# Altium footprint library coral-baseboard.PcbLib: 48 footprints (part 2 of 3)
Each footprint in its own frame and in the unit in brackets; x right, y up, seen from the top. Pads: shape width x height; smd on the part's side, far side on the other; paste and mask are expansions set on the pad; w line width, h text height; cw(c..) or ccw(c..) is an arc to the next point about the centre after c.
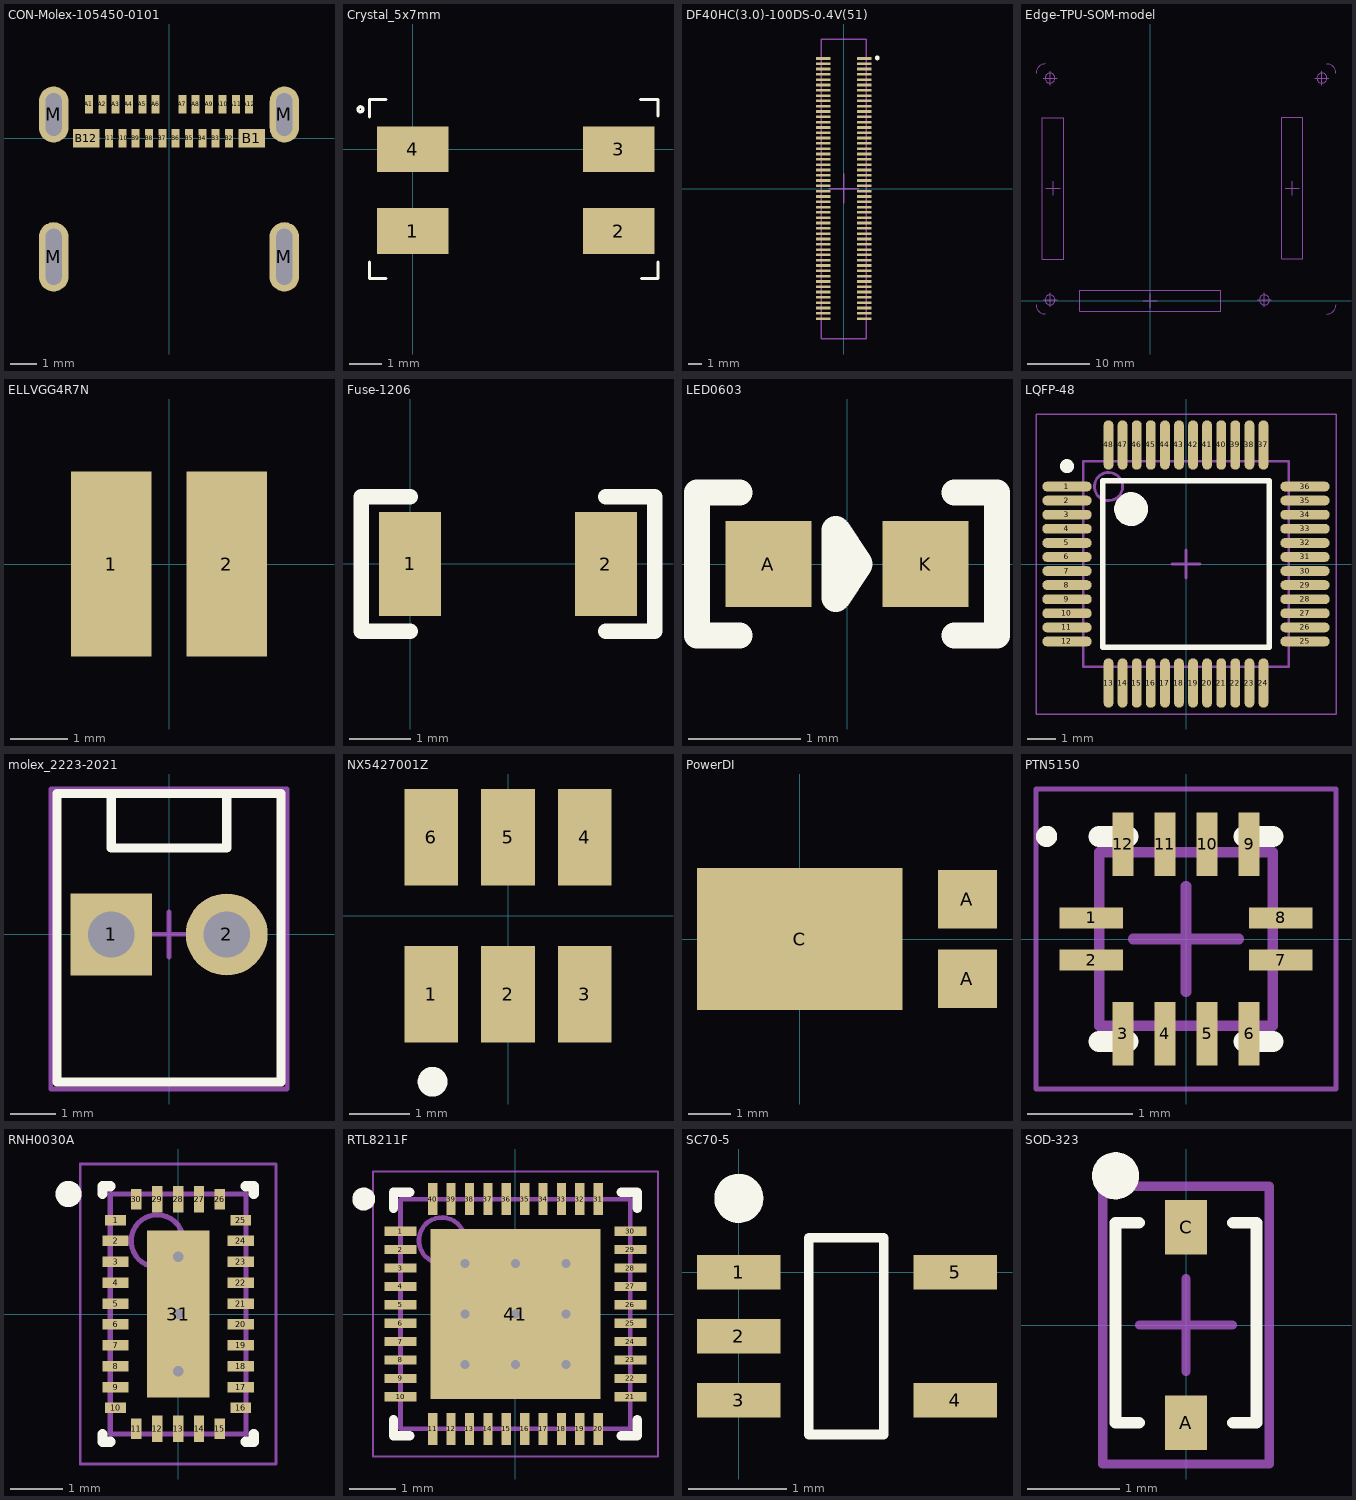
[diagram p1: the footprints below, top view; thin cyan lines are the x and y axes]

## CON-Molex-105450-0101 [mm]
height 2
pads (28):
  rect 0.3x0.7 smd: A1(-3,1.27) A2(-2.5,1.27) A3(-2,1.27) A4(-1.5,1.27) A5(-1,1.27) A6(-0.5,1.27) A7(0.5,1.27) A8(1,1.27) A9(1.5,1.27) A10(2,1.27) A11(2.5,1.27) A12(3,1.27) B2(2.25,0) B3(1.75,0) B4(1.25,0) B5(0.75,0) B6(0.25,0) B7(-0.25,0) B8(-0.75,0) B9(-1.25,0) B10(-1.75,0) B11(-2.25,0)
  rect 1x0.7 smd: B1(3.1,0) B12(-3.1,0)
  oval 1.1x2.6 hole 0.6 slot 2.1 at 90 deg: M(-4.32,-4.445) M(4.318,-4.445)
  oval 1.1x2.1 hole 0.6 slot 1.6 at 90 deg: M(-4.32,0.89) M(4.32,0.89)
3D body: height 3.22, standoff -0.74, extent -4.47,-6.351 4.47,1.549

## Crystal_5x7mm [mm]
height 1.1
pads (4):
  rect 2.2x1.4 smd: 1(0,-2.5) 2(6.3,-2.5) 3(6.3,0) 4(0,0)
Top Overlay:
  circle w0.1: c-1.6,1.225 r0.075
  lines w0.1: -1.325,-3.45 -1.325,-3.95 -0.825,-3.95 ; -1.325,1 -1.325,1.5 ; -1.325,1.525 -0.825,1.525 ; 6.975,1.525 7.475,1.525 ; 7,-3.95 7.5,-3.95 7.5,-3.45 ; 7.5,1.025 7.5,1.525
3D body: height 1.45, standoff 0.04, extent -0.35,-3.7 6.65,1.3

## DF40HC(3.0)-100DS-0.4V(51) [mm]
height 1.1
pads (100):
  rect 1.1x0.2 smd: 1(1.54,9.8) 2(-1.54,9.8) 3(1.54,9.4) 4(-1.54,9.4) 5(1.54,9) 6(-1.54,9) 7(1.54,8.6) 8(-1.54,8.6) 9(1.54,8.2) 10(-1.54,8.2) 11(1.54,7.8) 12(-1.54,7.8) 13(1.54,7.4) 14(-1.54,7.4) 15(1.54,7) 16(-1.54,7) 17(1.54,6.6) 18(-1.54,6.6) 19(1.54,6.2) 20(-1.54,6.2) 21(1.54,5.8) 22(-1.54,5.8) 23(1.54,5.4) 24(-1.54,5.4) 25(1.54,5) 26(-1.54,5) 27(1.54,4.6) 28(-1.54,4.6) 29(1.54,4.2) 30(-1.54,4.2) 31(1.54,3.8) 32(-1.54,3.8) 33(1.54,3.4) 34(-1.54,3.4) 35(1.54,3) 36(-1.54,3) 37(1.54,2.6) 38(-1.54,2.6) 39(1.54,2.2) 40(-1.54,2.2) 41(1.54,1.8) 42(-1.54,1.8) 43(1.54,1.4) 44(-1.54,1.4) 45(1.54,1) 46(-1.54,1) 47(1.54,0.6) 48(-1.54,0.6) 49(1.54,0.2) 50(-1.54,0.2) 51(1.54,-0.2) 52(-1.54,-0.2) 53(1.54,-0.6) 54(-1.54,-0.6) 55(1.54,-1) 56(-1.54,-1) 57(1.54,-1.4) 58(-1.54,-1.4) 59(1.54,-1.8) 60(-1.54,-1.8) 61(1.54,-2.2) 62(-1.54,-2.2) 63(1.54,-2.6) 64(-1.54,-2.6) 65(1.54,-3) 66(-1.54,-3) 67(1.54,-3.4) 68(-1.54,-3.4) 69(1.54,-3.8) 70(-1.54,-3.8) 71(1.54,-4.2) 72(-1.54,-4.2) 73(1.54,-4.6) 74(-1.54,-4.6) 75(1.54,-5) 76(-1.54,-5) 77(1.54,-5.4) 78(-1.54,-5.4) 79(1.54,-5.8) 80(-1.54,-5.8) 81(1.54,-6.2) 82(-1.54,-6.2) 83(1.54,-6.6) 84(-1.54,-6.6) 85(1.54,-7) 86(-1.54,-7) 87(1.54,-7.4) 88(-1.54,-7.4) 89(1.54,-7.8) 90(-1.54,-7.8) 91(1.54,-8.2) 92(-1.54,-8.2) 93(1.54,-8.6) 94(-1.54,-8.6) 95(1.54,-9) 96(-1.54,-9) 97(1.54,-9.4) 98(-1.54,-9.4) 99(1.54,-9.8) 100(-1.54,-9.8)
Top Overlay:
  circle w0.254: c2.53,9.845 r0.056
Mechanical 3:
  lines w0.1: -1.125,0 0,0 ; 0,-1.125 0,0 ; 0,1.125 0,0 ; 1.125,0 0,0 ; -1.69,-11.336 1.69,-11.336 1.69,11.264 -1.69,11.264 -1.69,-11.336
3D body: height 2.9, standoff 0, extent -1.69,-11.336 1.69,11.264

## Edge-TPU-SOM-model [mm]
Mechanical 3:
  circle w0.1: c-16,0.11 r0.8
  circle w0.1: c18.3,0.11 r0.8
  circle w0.1: c27.5,35.61 r0.8
  circle w0.1: c-16,35.61 r0.8
  lines w0.1: -18.25,-0.64 ccw(c-16.75,-0.64) -16.75,-2.14 ; -18.25,36.36 cw(c-16.75,36.36) -16.75,37.86 ; -17.125,0.11 -16,0.11 ; -17.125,35.61 -16,35.61 ; -16.655,17.97 -15.53,17.97 ; -16,-1.015 -16,0.11 ; -16,1.235 -16,0.11 ; -16,34.485 -16,35.61 ; -16,36.735 -16,35.61 ; -15.53,16.845 -15.53,17.97 ; -15.53,19.095 -15.53,17.97 ; -14.875,0.11 -16,0.11 ; -14.875,35.61 -16,35.61 ; -14.405,17.97 -15.53,17.97 ; -1.125,0 0,0 ; 0,-1.125 0,0 ; 0,1.125 0,0 ; 1.125,0 0,0 ; 17.175,0.11 18.3,0.11 ; 18.3,-1.015 18.3,0.11 ; 18.3,1.235 18.3,0.11 ; 19.425,0.11 18.3,0.11 ; 21.655,17.97 22.78,17.97 ; 22.78,16.845 22.78,17.97 ; 22.78,19.095 22.78,17.97 ; 23.905,17.97 22.78,17.97 ; 26.375,35.61 27.5,35.61 ; 27.5,34.485 27.5,35.61 ; 27.5,36.735 27.5,35.61 ; 28.25,-2.14 ccw(c28.25,-0.64) 29.75,-0.64 ; 28.25,37.86 cw(c28.25,36.36) 29.75,36.36 ; 28.625,35.61 27.5,35.61 ; -17.22,6.636 -17.22,29.236 -13.84,29.236 -13.84,6.636 -17.22,6.636 ; -11.264,-1.69 11.336,-1.69 11.336,1.69 -11.264,1.69 -11.264,-1.69 ; 21.09,6.706 21.09,29.306 24.47,29.306 24.47,6.706 21.09,6.706
3D body: height 7.22, standoff 2.11, extent -18.25,-2.14 29.75,37.86

## ELLVGG4R7N [mm]
pads (2):
  rect 1.4x3.2 smd: 1(-1,0) 2(1,0)

## Fuse-1206 [mm]
pads (2):
  rect 1.016x1.7 smd: 1(0,0) 2(3.2,0)
Top Overlay:
  lines w0.254: 0,-1.1 -0.8,-1.1 -0.8,1.1 0,1.1 ; 3.2,-1.1 4,-1.1 4,1.1 3.2,1.1
3D body: height 1.43, standoff -0.03, extent -0.026,-0.825 3.176,0.827

## LED0603 [mil]
pads (2):
  rect 30x30 smd: A(-27.5,0) K(27.5,0)
Top Overlay:
  lines w9: -37.5,-25 -52.5,-25 -52.5,25 -37.5,25 ; 37.5,-25 52.5,-25 52.5,25 37.5,25
  lines w10: -3.88,-11.81 -3.88,11.81 4,0 -3.88,-11.81
3D body: height 43.31, standoff 0, extent -31.83,-15.75 31.95,15.75

## LQFP-48 [mm] "LQFP-48, 48-Leads, Body 7.25x7.25mm, Pitch 0.50mm, IPC Medium Density"
height 1.6
pads (48):
  oval 1.75x0.35 smd: 1(-4.225,2.75) 2(-4.225,2.25) 3(-4.225,1.75) 4(-4.225,1.25) 5(-4.225,0.75) 6(-4.225,0.25) 7(-4.225,-0.25) 8(-4.225,-0.75) 9(-4.225,-1.25) 10(-4.225,-1.75) 11(-4.225,-2.25) 12(-4.225,-2.75) 25(4.225,-2.75) 26(4.225,-2.25) 27(4.225,-1.75) 28(4.225,-1.25) 29(4.225,-0.75) 30(4.225,-0.25) 31(4.225,0.25) 32(4.225,0.75) 33(4.225,1.25) 34(4.225,1.75) 35(4.225,2.25) 36(4.225,2.75)
  oval 0.35x1.75 smd: 13(-2.75,-4.225) 14(-2.25,-4.225) 15(-1.75,-4.225) 16(-1.25,-4.225) 17(-0.75,-4.225) 18(-0.25,-4.225) 19(0.25,-4.225) 20(0.75,-4.225) 21(1.25,-4.225) 22(1.75,-4.225) 23(2.25,-4.225) 24(2.75,-4.225) 37(2.75,4.225) 38(2.25,4.225) 39(1.75,4.225) 40(1.25,4.225) 41(0.75,4.225) 42(0.25,4.225) 43(-0.25,4.225) 44(-0.75,4.225) 45(-1.25,4.225) 46(-1.75,4.225) 47(-2.25,4.225) 48(-2.75,4.225)
Top Overlay:
  circle w0.6: c-1.95,1.95 r0.3
  circle w0.25: c-4.225,3.475 r0.125
  lines w0.2: -2.95,-2.95 2.95,-2.95 2.95,2.95 -2.95,2.95 -2.95,-2.95
Mechanical 13:
  circle w0.1: c-2.75,2.75 r0.5
  lines w0.1: -3.65,-3.65 3.65,-3.65 3.65,3.65 -3.65,3.65 -3.65,-3.65
Mechanical 15:
  lines w0.05: -5.325,-5.325 5.325,-5.325 5.325,5.325 -5.325,5.325 -5.325,-5.325
  lines w0.1: -0.5,0 0.5,0 ; 0,-0.5 0,0.5
3D body: height 1.6, standoff 0.15, extent -3.65,-3.65 3.65,3.65

## molex_2223-2021 [mm] "Pinhead male 1x2 pitch 2.54mm straight"
pads (2):
  rect 1.8x1.8 hole 1.02: 1(-1.27,0)
  round 1.8 hole 1.02: 2(1.27,0)
Top Overlay:
  lines w0.2: -1.27,3.1 -1.27,1.905 1.27,1.905 1.27,3.1 ; -2.465,-3.25 2.465,-3.25 2.465,3.1 -2.465,3.1 -2.465,-3.25
Mechanical 13:
  lines w0.1: -1.27,3.1 -1.27,1.905 1.27,1.905 1.27,3.1 ; -2.465,-3.25 2.465,-3.25 2.465,3.1 -2.465,3.1 -2.465,-3.25
Mechanical 15:
  lines w0.1: -0.5,0 0.5,0 ; 0,-0.5 0,0.5 ; -2.6,-3.4 -2.6,3.2 2.6,3.2 2.6,-3.4 -2.6,-3.4
3D body: height 10.68, standoff -3.54, extent -2.489,-3.2 2.439,3.15

## NX5427001Z [mm]
height 1.1
pads (6):
  rect 0.89x1.6 smd: 1(-1.27,-1.3) 2(0,-1.3) 3(1.27,-1.3) 4(1.27,1.3) 5(0,1.3) 6(-1.27,1.3)
Top Overlay:
  circle w0.254: c-1.25,-2.75 r0.12
3D body: height 1.2, standoff 0, extent -2.5,-1.6 2.5,1.6

## PowerDI [mm]
pads (3):
  rect 1.4x1.39 smd: A(3.962,-0.94) A(3.962,0.94)
  rect 4.86x3.36 smd: C(0,0)
3D body: height 1.17, standoff 0.02, extent -2.208,-2.083 4.392,1.967

## PTN5150 [mm]
height 0.4
pads (12):
  rect 0.6x0.2 smd: 1(-0.9,0.2) 2(-0.9,-0.2) 7(0.9,-0.2) 8(0.9,0.2)
  rect 0.2x0.6 smd: 3(-0.6,-0.9) 4(-0.2,-0.9) 5(0.2,-0.9) 6(0.6,-0.9) 9(0.6,0.9) 10(0.2,0.9) 11(-0.2,0.9) 12(-0.6,0.9)
Top Overlay:
  circle w0.1: c-1.325,0.975 r0.05
  lines w0.2: -0.825,-0.975 -0.55,-0.975 ; -0.825,0.975 -0.55,0.975 ; 0.55,-0.975 0.825,-0.975 ; 0.55,0.975 0.825,0.975
Mechanical 13:
  lines w0.1: -0.825,-0.825 -0.825,0.825 0.825,0.825 0.825,-0.825 -0.825,-0.825
Mechanical 15:
  lines w0.05: -1.425,-1.425 -1.425,1.425 1.425,1.425 1.425,-1.425 -1.425,-1.425
  lines w0.1: -0.5,0 0.5,0 ; 0,-0.5 0,0.5
3D body: height 0.4, standoff 0, extent -0.825,-0.825 0.825,0.825

## RNH0030A [mm]
height 0.8
pads (31):
  rect 0.4x0.2 smd: 1(-1.2,1.8) 10(-1.2,-1.8) 16(1.2,-1.8) 25(1.2,1.8)
  rect 0.5x0.2 smd: 2(-1.2,1.4) 3(-1.2,1) 4(-1.2,0.6) 5(-1.2,0.2) 6(-1.2,-0.2) 7(-1.2,-0.6) 8(-1.2,-1) 9(-1.2,-1.4) 17(1.2,-1.4) 18(1.2,-1) 19(1.2,-0.6) 20(1.2,-0.2) 21(1.2,0.2) 22(1.2,0.6) 23(1.2,1) 24(1.2,1.4)
  rect 0.2x0.4 smd: 11(-0.8,-2.2) 15(0.8,-2.2) 26(0.8,2.2) 30(-0.8,2.2)
  rect 0.2x0.5 smd: 12(-0.4,-2.2) 13(0,-2.2) 14(0.4,-2.2) 27(0.4,2.2) 28(0,2.2) 29(-0.4,2.2)
  rect 1.2x3.2 smd: 31(0,0)
via 0,1.1 diameter 0.5 hole 0.2
via 0,0 diameter 0.5 hole 0.2
via 0,-1.1 diameter 0.5 hole 0.2
Top Overlay:
  circle w0.25: c-2.1,2.3 r0.125
  lines w0.2: -1.45,-2.3 -1.45,-2.45 -1.3,-2.45 ; -1.45,2.3 -1.45,2.45 -1.3,2.45 ; 1.3,-2.45 1.45,-2.45 1.45,-2.3 ; 1.3,2.45 1.45,2.45 1.45,2.3
Mechanical 13:
  circle w0.1: c-0.4,1.4 r0.5
  lines w0.1: -1.3,-2.3 -1.3,2.3 1.3,2.3 1.3,-2.3 -1.3,-2.3
Mechanical 15:
  lines w0.05: -1.875,-2.875 -1.875,2.875 1.875,2.875 1.875,-2.875 -1.875,-2.875
  lines w0.1: -0.5,0 0.5,0 ; 0,-0.5 0,0.5
3D body: height 0.8, standoff 0.05, extent -1.3,-2.3 1.3,2.3

## RTL8211F [mm]
height 0.8
pads (41):
  rect 0.7x0.2 smd: 1(-2.5,1.8) 2(-2.5,1.4) 3(-2.5,1) 4(-2.5,0.6) 5(-2.5,0.2) 6(-2.5,-0.2) 7(-2.5,-0.6) 8(-2.5,-1) 9(-2.5,-1.4) 10(-2.5,-1.8) 21(2.5,-1.8) 22(2.5,-1.4) 23(2.5,-1) 24(2.5,-0.6) 25(2.5,-0.2) 26(2.5,0.2) 27(2.5,0.6) 28(2.5,1) 29(2.5,1.4) 30(2.5,1.8)
  rect 0.2x0.7 smd: 11(-1.8,-2.5) 12(-1.4,-2.5) 13(-1,-2.5) 14(-0.6,-2.5) 15(-0.2,-2.5) 16(0.2,-2.5) 17(0.6,-2.5) 18(1,-2.5) 19(1.4,-2.5) 20(1.8,-2.5) 31(1.8,2.5) 32(1.4,2.5) 33(1,2.5) 34(0.6,2.5) 35(0.2,2.5) 36(-0.2,2.5) 37(-0.6,2.5) 38(-1,2.5) 39(-1.4,2.5) 40(-1.8,2.5)
  rect 3.7x3.7 smd: 41(0,0)
via -1.1,-1.1 diameter 0.5 hole 0.2
via -1.1,0 diameter 0.5 hole 0.2
via -1.1,1.1 diameter 0.5 hole 0.2
via 0,1.1 diameter 0.5 hole 0.2
via 0,0 diameter 0.5 hole 0.2
via 1.1,-1.1 diameter 0.5 hole 0.2
via 1.1,0 diameter 0.5 hole 0.2
via 1.1,1.1 diameter 0.5 hole 0.2
via 0,-1.1 diameter 0.5 hole 0.2
Top Overlay:
  circle w0.25: c-3.3,2.5 r0.125
  lines w0.2: -2.65,-2.3 -2.65,-2.65 -2.3,-2.65 ; -2.65,2.3 -2.65,2.65 -2.3,2.65 ; 2.3,-2.65 2.65,-2.65 2.65,-2.3 ; 2.3,2.65 2.65,2.65 2.65,2.3
Mechanical 13:
  circle w0.1: c-1.6,1.6 r0.5
  lines w0.1: -2.5,-2.5 2.5,-2.5 2.5,2.5 -2.5,2.5 -2.5,-2.5
Mechanical 15:
  lines w0.05: -3.1,-3.1 3.1,-3.1 3.1,3.1 -3.1,3.1 -3.1,-3.1
  lines w0.1: -0.5,0 0.5,0 ; 0,-0.5 0,0.5
3D body: height 0.8, standoff 0, extent -2.5,-2.5 2.5,2.5

## SC70-5 [mm] "SC70, 5-Leads, Pitch 0,65mm, EIAJ SC-88a"
height 1.1
pads (5):
  rect 0.85x0.35 smd: 1(0,0) 2(0,-0.65) 3(0,-1.3) 4(2.2,-1.3) 5(2.2,0)
Top Overlay:
  circle w0.25: c0,0.75 r0.125
  lines w0.1: 0.711,-1.65 1.473,-1.65 1.473,0.35 0.711,0.35 0.711,-1.65
3D body: height 0.96, standoff 0.01, extent 0.068,-1.635 2.168,0.365

## SOD-323 [mm]
pads (2):
  rect 0.45x0.59 smd: A(0,-1.055) C(0,1.055)
Top Overlay:
  circle w0.254: c-0.762,1.612 r0.127
  lines w0.127: -0.508,-1.055 -0.762,-1.055 -0.762,1.104 -0.508,1.104 ; 0.508,-1.055 0.762,-1.055 0.762,1.104 0.508,1.104
Mechanical 15:
  lines w0.1: -0.5,0 0.5,0 ; 0,-0.5 0,0.5 ; -0.9,-1.5 -0.9,1.5 0,1.5 0.9,1.5 0.9,-1.5 -0.9,-1.5
3D body: height 1, standoff 0.01, extent -0.625,-1.25 0.625,1.25